# Altium footprint library Connectors.PcbLib: 135 footprints (part 5 of 9)
Each footprint in its own frame and in the unit in brackets; x right, y up, seen from the top. Pads: shape width x height; smd on the part's side, far side on the other; paste and mask are expansions set on the pad; w line width, h text height; cw(c..) or ccw(c..) is an arc to the next point about the centre after c.
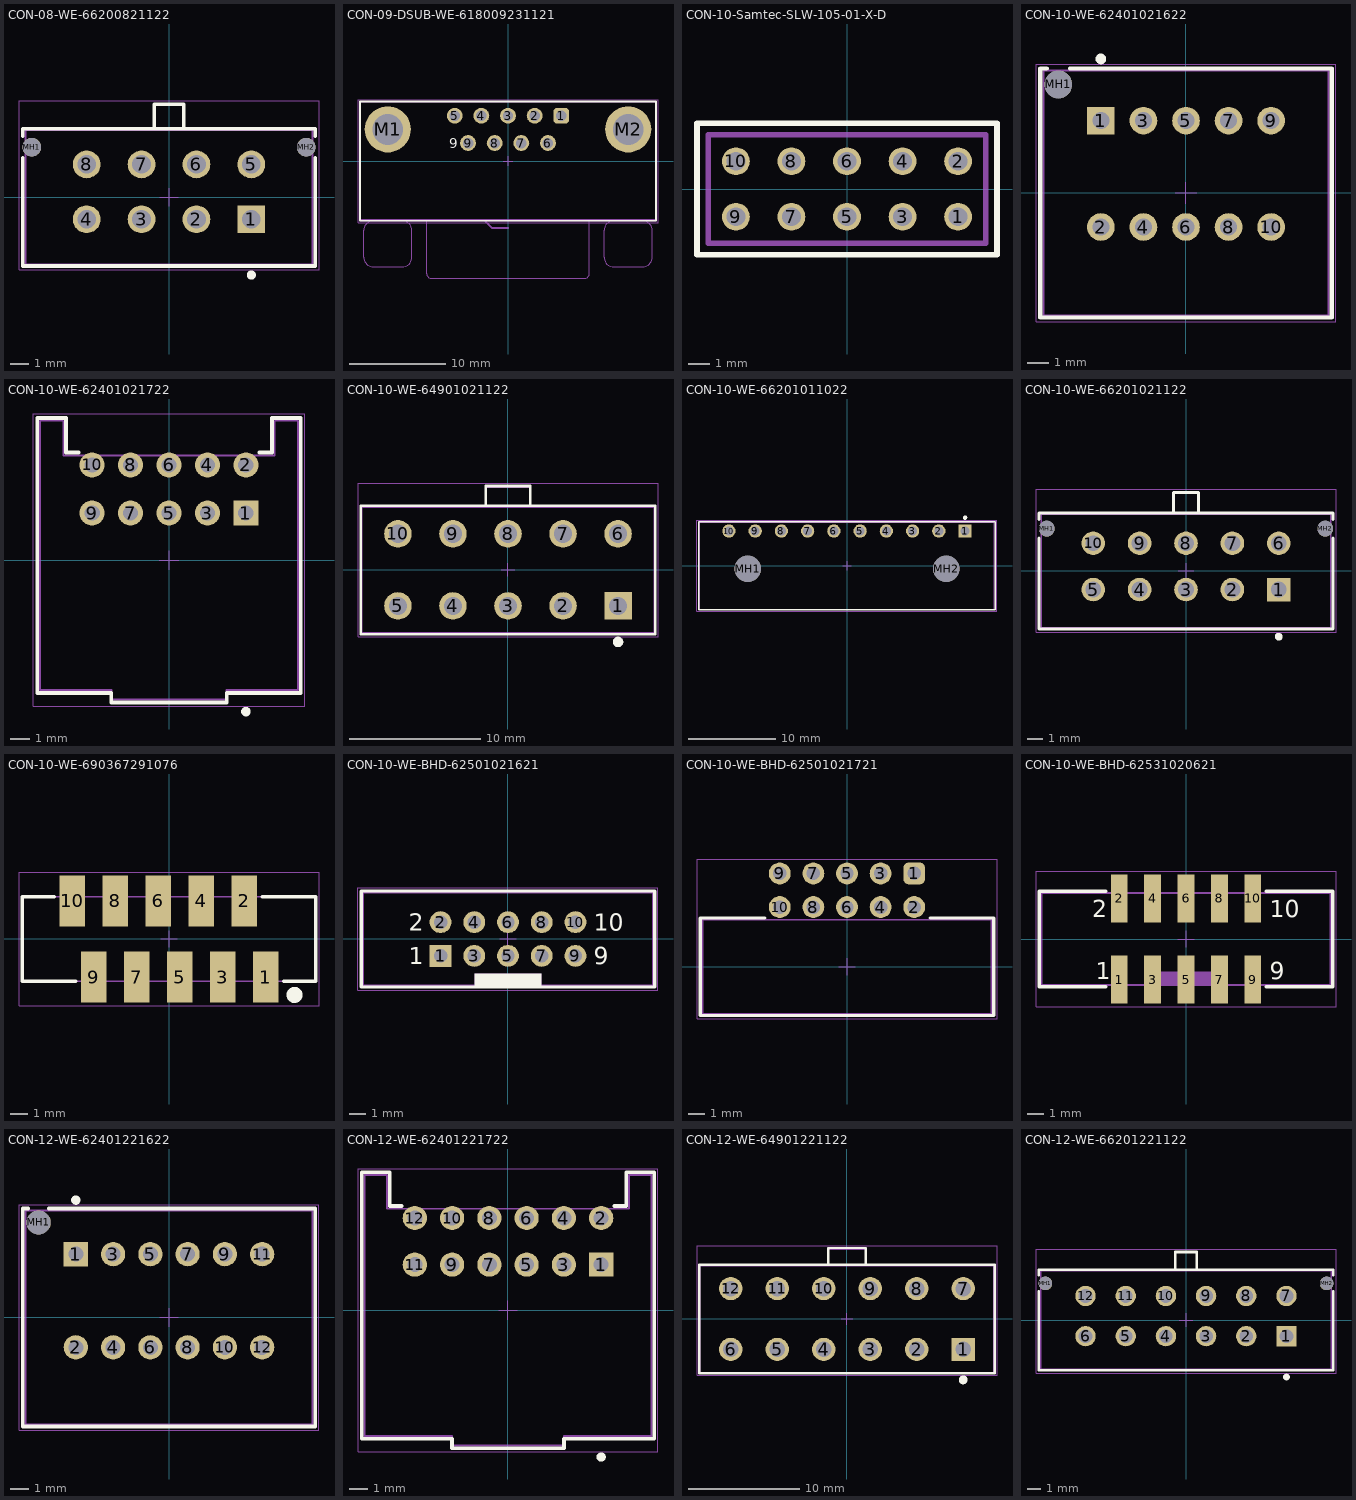
[diagram p4: the footprints below, top view; thin cyan lines are the x and y axes]

## CON-08-WE-66200821122 [mm] "Dual row Vertical header 08p"
height 9.9
pads (10):
  rect 1.52x1.52 hole 1.02: 1(4.5,-1.2)
  round 1.52 hole 1.02: 2(1.5,-1.2) 3(-1.5,-1.2) 4(-4.5,-1.2) 5(4.5,1.8) 6(1.5,1.8) 7(-1.5,1.8) 8(-4.5,1.8)
  round 1.02 hole 1.02 unplated: MH1(-7.5,2.74) MH2(7.5,2.74)
Top Overlay:
  circle w0.25: c4.5,-4.25 r0.125
  lines w0.2: -8,2.145 -8,-3.755 8,-3.755 8,2.145 ; -8,3.345 -8,3.755 8,3.755 8,3.345 ; -0.8,3.755 -0.8,5.08 0.8,5.08 0.8,3.755
Top Component Center:
  lines w0.05: -0.5,0 0.5,0 ; 0,-0.5 0,0.5
Top Component Outline:
  lines w0.1: -0.8,3.68 -0.8,5.08 0.8,5.08 0.8,3.68 ; -7.85,-3.68 -7.85,3.68 7.85,3.68 7.85,-3.68 -7.85,-3.68
Top Courtyard (Mech26):
  lines w0.05: -8.2,-3.955 8.2,-3.955 8.2,5.28 -8.2,5.28 -8.2,-3.955
3D body "66200821122.stp": height 9.93, standoff -3.17, extent -7.85,-3.68 7.85,5.08

## CON-09-DSUB-WE-618009231121 [mm] "9 pins, right angled, 8.08mm, with hex screw"
height 12.5
pads (11):
  rrect50% 1.65x1.65 hole 1.09: 1(5.54,4.72)
  round 1.65 hole 1.09: 2(2.77,4.72) 3(0,4.72) 4(-2.77,4.72) 5(-5.54,4.72) 6(4.155,1.88) 7(1.385,1.88) 8(-1.385,1.88) 9(-4.155,1.88)
  round 4.8 hole 3.2: M1(-12.5,3.3) M2(12.5,3.3)
Top Overlay:
  lines w0.2: -15.4,-6.2 -15.4,6.2 15.4,6.2 15.4,-6.2 -15.4,-6.2
  text "9" at -6.1,1.35 h1.02
Assembly Notes:
  lines w0.2: -15.4,-6.12 15.4,-6.12 ; -2.5,-6.12 -1.67,-6.95 0,-6.95
  text "PCB Edge" at 0.4,-7.55 h1.02
Bottom Courtyard (Mech15):
  lines w0.05: -0.5,0 0.5,0 ; 0,-0.5 0,0.5
Top Component Outline:
  lines w0.1: -15.4,-6.2 -15.4,6.2 ; -15.4,-6.2 15.4,-6.2 ; -15.4,-6.2 -15.4,6.2 ; -15.4,-6.2 15.4,-6.2 ; -15.4,6.2 15.4,6.2 ; -15.4,6.2 15.4,6.2 ; -15,-10 ccw(c-14,-10) -14,-11 ; -15,-10 ccw(c-14,-10) -14,-11 ; -15,-10 -15,-7.2 ; -15,-10 -15,-7.2 ; -15,-7.2 cw(c-14,-7.2) -14,-6.2 ccw(c-14,-7.2) -15,-7.2 ; -14,-11 -11,-11 ; -14,-11 -11,-11 ; -11,-11 ccw(c-11,-10) -10,-10 ; -11,-11 ccw(c-11,-10) -10,-10 ; -10,-10 -10,-7.2 ; -10,-10 -10,-7.2 ; -10,-7.2 ccw(c-11,-7.2) -11,-6.2 cw(c-11,-7.2) -10,-7.2 ; -8.45,-11.7 ccw(c-7.95,-11.7) -7.95,-12.2 ; -8.45,-11.7 ccw(c-7.95,-11.7) -7.95,-12.2 ; -8.45,-11.7 -8.45,-6.2 -8.45,-11.7 ; -7.95,-12.2 7.95,-12.2 ; -7.95,-12.2 7.95,-12.2 ; 7.95,-12.2 ccw(c7.95,-11.7) 8.45,-11.7 ; 7.95,-12.2 ccw(c7.95,-11.7) 8.45,-11.7 ; 7.95,-12.2 7.95,-12.2 ; 7.95,-12.2 7.95,-12.2 ; 8.45,-11.7 8.45,-6.2 8.45,-11.7 ; 10,-10 ccw(c11,-10) 11,-11 ; 10,-10 ccw(c11,-10) 11,-11 ; 10,-10 10,-7.2 ; 10,-10 10,-7.2 ; 10,-7.2 cw(c11,-7.2) 11,-6.2 ccw(c11,-7.2) 10,-7.2 ; 11,-11 14,-11 ; 11,-11 14,-11 ; 14,-11 ccw(c14,-10) 15,-10 ; 14,-11 ccw(c14,-10) 15,-10 ; 15,-10 15,-7.2 ; 15,-10 15,-7.2 ; 15,-7.2 ccw(c14,-7.2) 14,-6.2 cw(c14,-7.2) 15,-7.2 ; 15.4,-6.2 15.4,6.2 ; 15.4,-6.2 15.4,6.2
Top Courtyard (Mech26):
  lines w0.05: -15.6,-6.4 15.6,-6.4 15.6,6.4 -15.6,6.4 -15.6,-6.4
Top Designator:
  text ".Designator" at -1.75,-0.75 h1.5
3D body "618009231121.stp": height 12.55, standoff -3.95, extent -15.4,-12.2 15.4,6.2

## CON-10-Samtec-SLW-105-01-X-D [mil]
pads (10):
  round 50 hole 34 mask+3: 1(200,-50) 2(200,50) 3(100,-50) 4(100,50) 5(0,-50) 6(0,50) 7(-100,-50) 8(-100,50) 9(-200,-50) 10(-200,50)
Top Overlay:
  lines w10: -270,-118 270,-118 270,118 -270,118 -270,-118
Top Component Outline:
  lines w10: -250,-98 -250,98 250,98 250,-98 -250,-98
3D body "SLW-105-01-F-D.stp": height 184.92, standoff -110.08, extent -250,-97.5 250,97.5

## CON-10-WE-62401021622 [mm] "2.00mm Male Dual Row Vertical Shrouded Header with positive locking, 10p"
height 11.6
pads (11):
  rect 1.3x1.3 hole 0.8: 1(-4,3.4)
  round 1.3 hole 0.8: 2(-4,-1.6) 3(-2,3.4) 4(-2,-1.6) 5(0,3.4) 6(0,-1.6) 7(2,3.4) 8(2,-1.6) 9(4,3.4) 10(4,-1.6)
  round 1.3 hole 1.3 unplated: MH1(-6,5.1)
Top Overlay:
  circle w0.25: c-4,6.3 r0.125
  lines w0.2: -6.55,5.85 -6.85,5.85 -6.85,-5.85 6.85,-5.85 6.85,5.85 -5.45,5.85
Top Component Center:
  lines w0.05: -0.5,0 0.5,0 ; 0,-0.5 0,0.5
Top Component Outline:
  lines w0.1: -6.7,-5.75 6.7,-5.75 6.7,5.75 -6.7,5.75 ; -6.7,-5.75 -6.7,5.75 ; -6.7,-5.75 -6.7,5.75
Top Courtyard (Mech26):
  lines w0.05: -7.05,-6.05 7.05,-6.05 7.05,6.05 -7.05,6.05 -7.05,-6.05
3D body "62401021622.stp": height 9.78, standoff -3.17, extent -6.7,-5.75 6.7,5.75

## CON-10-WE-62401021722 [mm] "2.00mm Male Dual Row Horizontal Shrouded Header with positive locking, 10p"
height 11.7
pads (10):
  rect 1.3x1.3 hole 0.8: 1(4,2.45)
  round 1.3 hole 0.8: 2(4,4.95) 3(2,2.45) 4(2,4.95) 5(0,2.45) 6(0,4.95) 7(-2,2.45) 8(-2,4.95) 9(-4,2.45) 10(-4,4.95)
Top Overlay:
  circle w0.25: c4,-7.875 r0.125
  lines w0.2: -4.7,5.6 -5.35,5.6 -5.35,7.4 -6.85,7.4 -6.85,-6.9 -3,-6.9 -3,-7.4 3,-7.4 3,-6.9 6.85,-6.9 6.85,7.4 5.35,7.4 5.35,5.6 4.7,5.6
Top Component Center:
  lines w0.05: -0.5,0 0.5,0 ; 0,-0.5 0,0.5
Top Component Outline:
  lines w0.1: -6.7,-6.75 -3,-6.75 -3,-7.25 3,-7.25 3,-6.75 6.7,-6.75 6.7,7.25 5.5,7.25 5.5,5.45 -5.5,5.45 -5.5,7.25 -6.7,7.25 -6.7,-6.75
Top Courtyard (Mech26):
  lines w0.05: -7.05,-7.6 7.05,-7.6 7.05,7.6 -7.05,7.6 -7.05,-7.6
3D body "62401021722.stp": height 11.73, standoff -3.17, extent -6.7,-7.25 6.7,7.25

## CON-10-WE-64901021122 [mm] "4.20mm Male Dual Row Vertical Header, 10p"
height 12.8
pads (10):
  rect 2.1x2.1 hole 1.4: 1(8.4,-2.75)
  round 2.1 hole 1.4: 2(4.2,-2.75) 3(0,-2.75) 4(-4.2,-2.75) 5(-8.4,-2.75) 6(8.4,2.75) 7(4.2,2.75) 8(0,2.75) 9(-4.2,2.75) 10(-8.4,2.75)
Top Overlay:
  circle w0.4: c8.4,-5.5 r0.2
  lines w0.2: -1.7,4.9 -1.7,6.4 1.7,6.4 1.7,4.9 ; -11.25,-4.9 -11.25,4.9 11.25,4.9 11.25,-4.9 -11.25,-4.9
Top Component Center:
  lines w0.05: -0.5,0 0.5,0 ; 0,-0.5 0,0.5
Top Component Outline:
  lines w0.1: -1.7,4.8 -1.7,6.3 1.7,6.3 1.7,4.8 ; -11.15,-4.8 -11.15,4.8 11.15,4.8 11.15,-4.8 -11.15,-4.8
Top Courtyard (Mech26):
  lines w0.05: -11.45,-5.1 -11.45,6.6 11.45,6.6 11.45,-5.1 -11.45,-5.1
3D body "64901021122.stp": height 12.82, standoff -3.48, extent -11.15,-4.8 11.45,6.3

## CON-10-WE-66201011022 [mm] "3.00mm Male Single Row Angled Header with Plastic Pegs, 10p"
height 5.07
pads (12):
  rect 1.52x1.52 hole 1.02: 1(13.5,3.97)
  round 1.52 hole 1.02: 2(10.5,3.97) 3(7.5,3.97) 4(4.5,3.97) 5(1.5,3.97) 6(-1.5,3.97) 7(-4.5,3.97) 8(-7.5,3.97) 9(-10.5,3.97) 10(-13.5,3.97)
  round 3 hole 3 unplated: MH1(-11.35,-0.35) MH2(11.35,-0.35)
Top Overlay:
  circle w0.25: c13.5,5.5 r0.125
  lines w0.2: -16.95,-5.025 -16.95,5.025 16.95,5.025 16.95,-5.025 -16.95,-5.025
Top Component Center:
  lines w0.05: -0.5,0 0.5,0 ; 0,-0.5 0,0.5
Top Component Outline:
  lines w0.1: -16.825,-4.95 16.825,-4.95 16.825,4.95 -16.825,4.95 -16.825,-4.95
Top Courtyard (Mech26):
  lines w0.05: -17.15,-5.225 -17.15,5.225 17.15,5.225 17.15,-5.225 -17.15,-5.225
3D body "66201011022.stp": height 5.6, standoff -3.16, extent -16.825,-4.95 16.825,4.95

## CON-10-WE-66201021122 [mm] "Dual row Vertical header 10p"
height 9.9
pads (12):
  rect 1.52x1.52 hole 1.02: 1(6,-1.2)
  round 1.52 hole 1.02: 2(3,-1.2) 3(0,-1.2) 4(-3,-1.2) 5(-6,-1.2) 6(6,1.8) 7(3,1.8) 8(0,1.8) 9(-3,1.8) 10(-6,1.8)
  round 1.02 hole 1.02 unplated: MH1(-9,2.74) MH2(9,2.74)
Top Overlay:
  circle w0.25: c6,-4.25 r0.125
  lines w0.2: -9.5,2.145 -9.5,-3.755 9.5,-3.755 9.5,2.145 ; -9.5,3.345 -9.5,3.755 9.5,3.755 9.5,3.345 ; -0.8,3.755 -0.8,5.08 0.8,5.08 0.8,3.755
Top Component Center:
  lines w0.05: -0.5,0 0.5,0 ; 0,-0.5 0,0.5
Top Component Outline:
  lines w0.1: -0.8,3.68 -0.8,5.08 0.8,5.08 0.8,3.68 ; -9.35,-3.68 9.35,-3.68 9.35,3.68 -9.35,3.68 -9.35,-3.68
Top Courtyard (Mech26):
  lines w0.05: -9.7,-3.955 -9.7,5.28 9.7,5.28 9.7,-3.955 -9.7,-3.955
3D body "66201021122.stp": height 9.93, standoff -3.17, extent -9.35,-3.68 9.35,5.08

## CON-10-WE-690367291076 [mm] "MiniModule Connectors, PCB Type, Female, SMT, Vertical, 10p"
height 5.45
pads (10):
  rect 1.5x3 smd: 1(5.715,-2.25) 2(4.445,2.25) 3(3.175,-2.25) 4(1.905,2.25) 5(0.635,-2.25) 6(-0.635,2.25) 7(-1.905,-2.25) 8(-3.175,2.25) 9(-4.445,-2.25) 10(-5.715,2.25)
Top Overlay:
  circle w0.5: c7.41,-3.3 r0.224
  lines w0.2: -6.76,2.5 -8.65,2.5 -8.65,-2.5 -5.51,-2.5 ; 5.51,2.5 8.65,2.5 8.65,-2.5 6.76,-2.5
Top Component Center:
  lines w0.05: -0.5,0 0.5,0 ; 0,-0.5 0,0.5
Top Component Outline:
  lines w0.1: -8.65,-2.5 8.65,-2.5 8.65,2.5 -8.65,2.5 -8.65,-2.5
Top Courtyard (Mech26):
  lines w0.05: -8.85,-3.95 8.85,-3.95 8.85,3.95 -8.85,3.95 -8.85,-3.95
3D body "690367291076.stp": height 5.75, standoff 0, extent -8.645,-3.498 8.645,3.499

## CON-10-WE-BHD-62501021621 [mm] "2.00mm Male Box Header, 10p"
height 5.6
pads (10):
  rect 1.3x1.3 hole 0.8: 1(-4,-1)
  round 1.3 hole 0.8: 2(-4,1) 3(-2,-1) 4(-2,1) 5(0,-1) 6(0,1) 7(2,-1) 8(2,1) 9(4,-1) 10(4,1)
Top Overlay:
  rectangle: -2,-2.85 2,-2.05
  lines w0.2: -8.7,-2.85 -8.7,2.85 8.7,2.85 8.7,-2.85 -8.7,-2.85
  text "10" at 5.1,0.5 h1.02
  text "2" at -5.9,0.5 h1.02
  text "1" at -5.9,-1.5 h1.02
  text "9" at 5.1,-1.5 h1.02
Top Component Center:
  lines w0.05: -0.5,0 0.5,0 ; 0,-0.5 0,0.5
Top Component Outline:
  rectangle: -2,-2.75 2,-2.05
  lines w0.1: -8.6,-2.75 -8.6,2.75 8.6,2.75 8.6,-2.75 -8.6,-2.75
Top Courtyard (Mech26):
  lines w0.05: -8.9,-3.05 -8.9,3.05 8.9,3.05 8.9,-3.05 -8.9,-3.05
3D body "62501021621.stp": height 5.65, standoff -2.5, extent -8.6,-2.75 8.6,2.75

## CON-10-WE-BHD-62501021721 [mm] "2.00mm Male Angled Box Header, 10p"
height 5.4
pads (10):
  rrect50% 1.3x1.3 hole 0.8: 1(4,5.55)
  round 1.3 hole 0.8: 2(4,3.55) 3(2,5.55) 4(2,3.55) 5(0,5.55) 6(0,3.55) 7(-2,5.55) 8(-2,3.55) 9(-4,5.55) 10(-4,3.55)
Top Overlay:
  lines w0.2: -4.9,2.9 -8.725,2.9 -8.725,-2.9 8.725,-2.9 8.725,2.9 4.95,2.9
Top Component Center:
  lines w0.05: -0.5,0 0.5,0 ; 0,-0.5 0,0.5
Top Component Outline:
  lines w0.1: -8.6,-2.8 -8.6,2.8 8.6,2.8 8.6,-2.8 -8.6,-2.8
Top Courtyard (Mech26):
  lines w0.05: -8.925,-3.1 -8.925,6.4 8.925,6.4 8.925,-3.1 -8.925,-3.1
Top Designator:
  text ".Designator" at -7.498,-0.5 h1.5
3D body "62501021721.stp": height 5.5, standoff -2.83, extent -8.6,-2.8 8.6,5.85

## CON-10-WE-BHD-62531020621 [mm] "2.00mm Male SMT Box Header, 10p"
height 6.8
pads (10):
  rect 1x2.85 smd: 1(-4,-2.425) 2(-4,2.425) 3(-2,-2.425) 4(-2,2.425) 5(0,-2.425) 6(0,2.425) 7(2,-2.425) 8(2,2.425) 9(4,-2.425) 10(4,2.425)
Top Overlay:
  lines w0.2: -4.8,-2.85 -8.775,-2.85 -8.775,2.85 -4.8,2.85 ; 4.8,-2.85 8.775,-2.85 8.775,2.85 4.8,2.85
  text "1" at -5.4,-2.4 h1.02
  text "2" at -5.6,1.3 h1.02
  text "9" at 5,-2.4 h1.02
  text "10" at 5,1.3 h1.02
Top Component Center:
  lines w0.05: -0.5,0 0.5,0 ; 0,-0.5 0,0.5
Top Component Outline:
  rectangle: -2,-2.75 2,-1.95
  lines w0.1: -4.25,-2.75 -4.25,-3.75 -3.75,-3.75 -3.75,-2.75 ; -4.25,2.75 -4.25,3.75 -3.75,3.75 -3.75,2.75 ; -2.25,-2.75 -2.25,-3.75 -1.75,-3.75 -1.75,-2.75 ; -2.25,2.75 -2.25,3.75 -1.75,3.75 -1.75,2.75 ; -0.25,-2.75 -0.25,-3.75 0.25,-3.75 0.25,-2.75 ; -0.25,2.75 -0.25,3.75 0.25,3.75 0.25,2.75 ; 1.75,-2.75 1.75,-3.75 2.25,-3.75 2.25,-2.75 ; 1.75,2.75 1.75,3.75 2.25,3.75 2.25,2.75 ; 3.75,-2.75 3.75,-3.75 4.25,-3.75 4.25,-2.75 ; 3.75,2.75 3.75,3.75 4.25,3.75 4.25,2.75 ; -8.625,-2.75 8.625,-2.75 8.625,2.75 -8.625,2.75 -8.625,-2.75
Top Courtyard (Mech26):
  lines w0.05: -8.975,-4.05 -8.975,4.05 8.975,4.05 8.975,-4.05 -8.975,-4.05
3D body "62531020621 (rev1).stp": height 8.55, standoff 0, extent -8.625,-3.75 8.625,3.75

## CON-12-WE-62401221622 [mm] "2.00mm Male Dual Row Vertical Shrouded Header with positive locking, 12p"
height 11.6
pads (13):
  rect 1.3x1.3 hole 0.8: 1(-5,3.4)
  round 1.3 hole 0.8: 2(-5,-1.6) 3(-3,3.4) 4(-3,-1.6) 5(-1,3.4) 6(-1,-1.6) 7(1,3.4) 8(1,-1.6) 9(3,3.4) 10(3,-1.6) 11(5,3.4) 12(5,-1.6)
  round 1.3 hole 1.3 unplated: MH1(-7,5.1)
Top Overlay:
  circle w0.25: c-5,6.3 r0.125
  lines w0.2: -7.55,5.85 -7.85,5.85 -7.85,-5.85 7.85,-5.85 7.85,5.85 -6.45,5.85
Top Component Center:
  lines w0.05: -0.5,0 0.5,0 ; 0,-0.5 0,0.5
Top Component Outline:
  lines w0.1: -7.7,-5.75 -7.7,5.75 ; -7.7,-5.75 -7.7,5.75 ; -7.7,-5.75 7.7,-5.75 7.7,5.75 -7.7,5.75
Top Courtyard (Mech26):
  lines w0.05: -8.05,-6.05 8.05,-6.05 8.05,6.05 -8.05,6.05 -8.05,-6.05
3D body "62401221622.stp": height 9.78, standoff -3.17, extent -7.7,-5.75 7.7,5.75

## CON-12-WE-62401221722 [mm] "2.00mm Male Dual Row Horizontal Shrouded Header with positive locking, 12p"
height 11.7
pads (12):
  rect 1.3x1.3 hole 0.8: 1(5,2.45)
  round 1.3 hole 0.8: 2(5,4.95) 3(3,2.45) 4(3,4.95) 5(1,2.45) 6(1,4.95) 7(-1,2.45) 8(-1,4.95) 9(-3,2.45) 10(-3,4.95) 11(-5,2.45) 12(-5,4.95)
Top Overlay:
  circle w0.25: c5,-7.875 r0.125
  lines w0.2: -5.7,5.6 -6.35,5.6 -6.35,7.4 -7.85,7.4 -7.85,-6.9 -3,-6.9 -3,-7.4 3,-7.4 3,-6.9 7.85,-6.9 7.85,7.4 6.35,7.4 6.35,5.6 5.7,5.6
Top Component Center:
  lines w0.05: -0.5,0 0.5,0 ; 0,-0.5 0,0.5
Top Component Outline:
  lines w0.1: -7.7,-6.75 -3,-6.75 -3,-7.25 3,-7.25 3,-6.75 7.7,-6.75 7.7,7.25 6.5,7.25 6.5,5.45 -6.5,5.45 -6.5,7.25 -7.7,7.25 -7.7,-6.75
Top Courtyard (Mech26):
  lines w0.05: -8.05,-7.6 -8.05,7.6 8.05,7.6 8.05,-7.6 -8.05,-7.6
3D body "62401221722.stp": height 11.73, standoff -3.17, extent -7.7,-7.25 7.7,7.25

## CON-12-WE-64901221122 [mm] "4.20mm Male Dual Row Vertical Header, 12p"
height 12.8
pads (12):
  rect 2.1x2.1 hole 1.4: 1(10.5,-2.75)
  round 2.1 hole 1.4: 2(6.3,-2.75) 3(2.1,-2.75) 4(-2.1,-2.75) 5(-6.3,-2.75) 6(-10.5,-2.75) 7(10.5,2.75) 8(6.3,2.75) 9(2.1,2.75) 10(-2.1,2.75) 11(-6.3,2.75) 12(-10.5,2.75)
Top Overlay:
  circle w0.4: c10.5,-5.5 r0.2
  lines w0.2: -1.7,4.9 -1.7,6.4 1.7,6.4 1.7,4.9 ; -13.35,-4.9 -13.35,4.9 13.35,4.9 13.35,-4.9 -13.35,-4.9
Top Component Center:
  lines w0.05: -0.5,0 0.5,0 ; 0,-0.5 0,0.5
Top Component Outline:
  lines w0.1: -1.7,4.8 -1.7,6.3 1.7,6.3 1.7,4.8 ; -13.25,-4.8 -13.25,4.8 13.25,4.8 13.25,-4.8 -13.25,-4.8
Top Courtyard (Mech26):
  lines w0.05: -13.55,-5.1 -13.55,6.6 13.55,6.6 13.55,-5.1 -13.55,-5.1
3D body "64901221122.stp": height 12.82, standoff -3.48, extent -13.25,-4.8 13.55,6.3

## CON-12-WE-66201221122 [mm] "Dual row Vertical header 12p"
height 9.9
pads (14):
  rect 1.52x1.52 hole 1.02: 1(7.5,-1.2)
  round 1.52 hole 1.02: 2(4.5,-1.2) 3(1.5,-1.2) 4(-1.5,-1.2) 5(-4.5,-1.2) 6(-7.5,-1.2) 7(7.5,1.8) 8(4.5,1.8) 9(1.5,1.8) 10(-1.5,1.8) 11(-4.5,1.8) 12(-7.5,1.8)
  round 1.02 hole 1.02 unplated: MH1(-10.5,2.74) MH2(10.5,2.74)
Top Overlay:
  circle w0.25: c7.5,-4.25 r0.125
  lines w0.2: -11,2.145 -11,-3.755 11,-3.755 11,2.145 ; -11,3.345 -11,3.755 11,3.755 11,3.345 ; -0.8,3.755 -0.8,5.08 0.8,5.08 0.8,3.755
Top Component Center:
  lines w0.05: -0.5,0 0.5,0 ; 0,-0.5 0,0.5
Top Component Outline:
  lines w0.1: -0.8,3.68 -0.8,5.08 0.8,5.08 0.8,3.68 ; -10.85,-3.68 -10.85,3.68 10.85,3.68 10.85,-3.68 -10.85,-3.68
Top Courtyard (Mech26):
  lines w0.05: -11.2,-3.955 -11.2,5.28 11.2,5.28 11.2,-3.955 -11.2,-3.955
3D body "66201221122.stp": height 9.93, standoff -3.17, extent -10.85,-3.68 10.85,5.08